# Altium footprint library mmyLibrary.PcbLib: 231 footprints (part 1 of 15)
Each footprint in its own frame and in the unit in brackets; x right, y up, seen from the top. Pads: shape width x height; smd on the part's side, far side on the other; paste and mask are expansions set on the pad; w line width, h text height; cw(c..) or ccw(c..) is an arc to the next point about the centre after c.
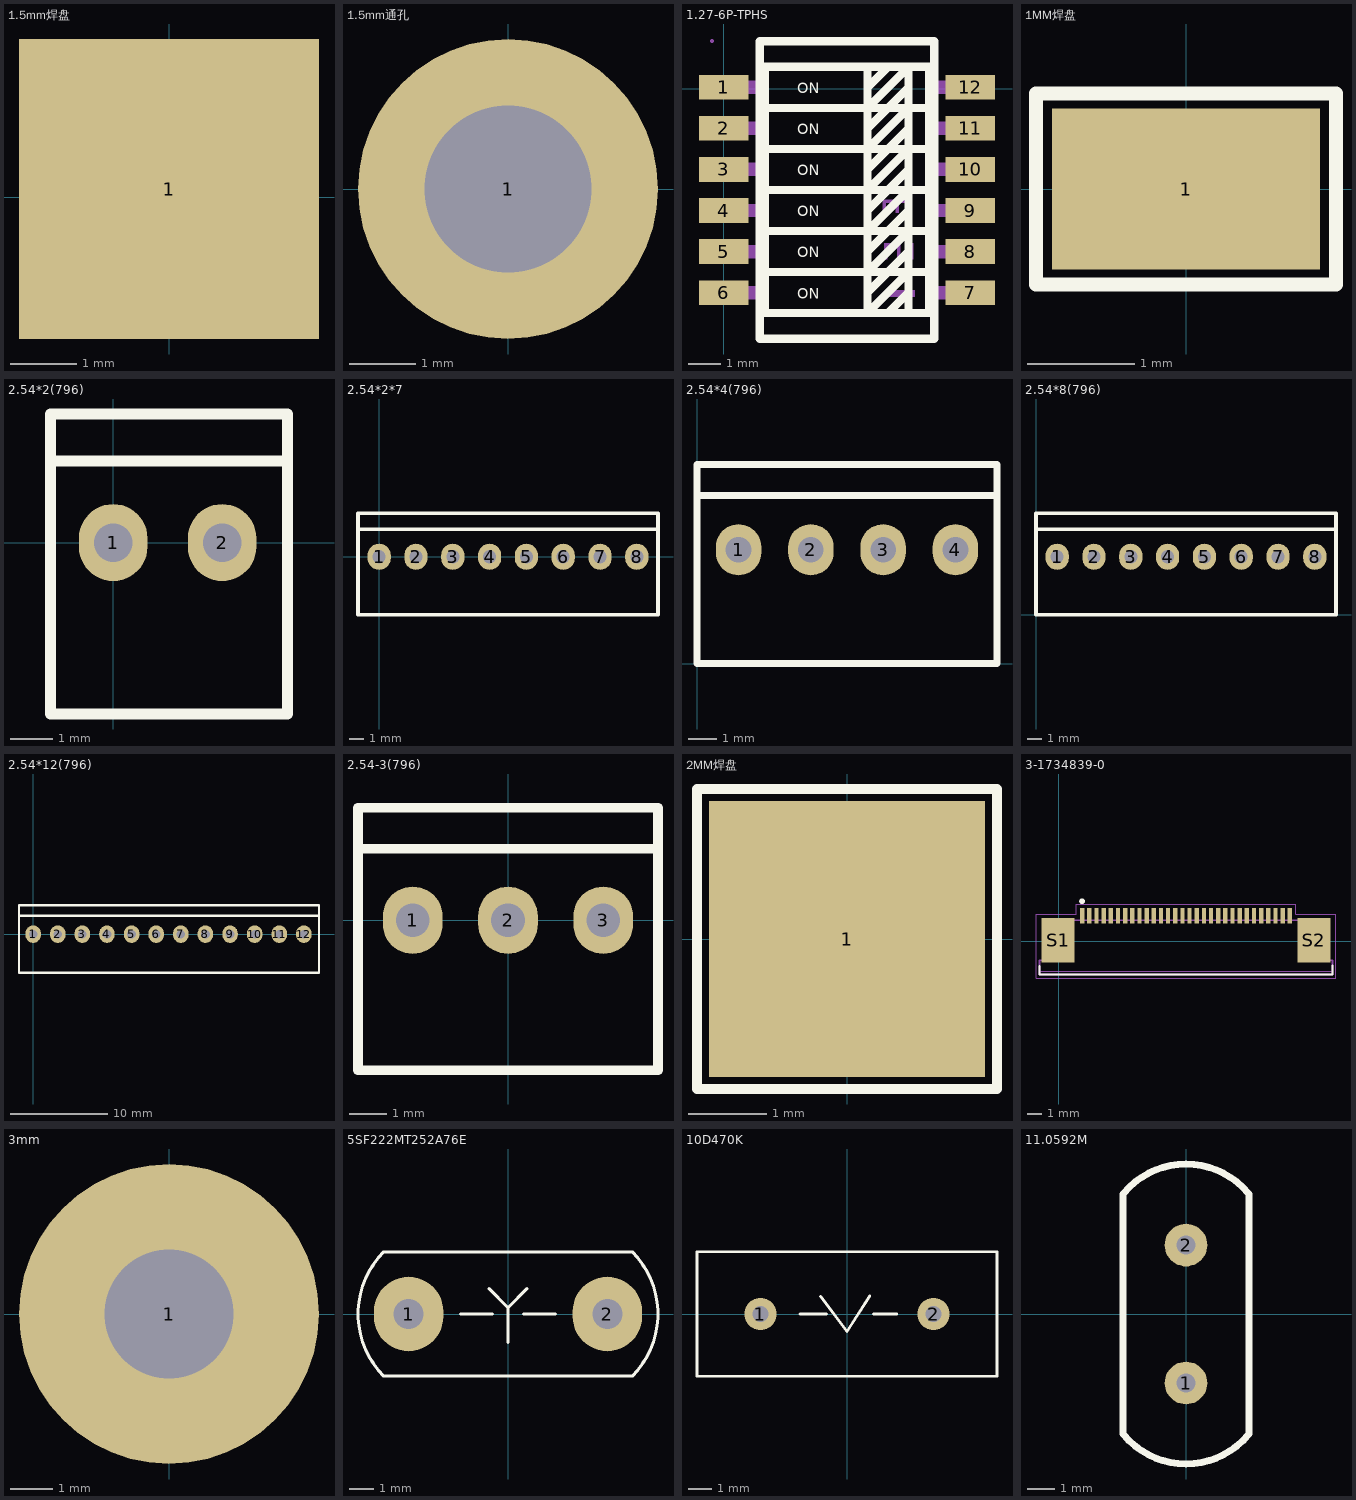
[diagram p0: the footprints below, top view; thin cyan lines are the x and y axes]

## 1.5mm焊盘 [mm]
pads (1):
  rect 4.5x4.5 smd: 1(0,0.127)

## 1.5mm通孔 [mm]
pads (1):
  round 4.5 hole 2.5: 1(0,0)

## 1.27-6P-TPHS [mil]
pads (12):
  rect 60x30 smd mask+2: 1(0,1.5) 2(0,-48.5) 3(0,-98.5) 4(0,-148.5) 5(0,-198.5) 6(0,-248.5) 7(300,-248.5) 8(300,-198.5) 9(300,-148.5) 10(300,-98.5) 11(300,-48.5) 12(300,1.5)
Top Overlay:
  lines w10: 175,-248.5 200,-223.5 225,-198.5 ; 175,-198.5 200,-173.5 225,-148.5 ; 175,-148.5 200,-123.5 225,-98.5 ; 175,-98.5 200,-73.5 225,-48.5 ; 175,-48.5 200,-23.5 225,1.5 ; 175,1.5 200,26.5 ; 175,26.5 175,-23.5 ; 200,-273.5 225,-248.5 ; 225,-273.5 225,-223.5 ; 50,-223.5 50,-173.5 ; 50,-223.5 250,-223.5 ; 50,-223.5 250,-223.5 ; 50,-223.5 250,-223.5 ; 50,-223.5 50,-273.5 250,-273.5 250,-223.5 ; 50,-223.5 250,-223.5 ; 50,-223.5 250,-223.5 ; 50,-223.5 250,-223.5 ; 50,-173.5 250,-173.5 ; 50,-173.5 250,-173.5 ; 50,-173.5 250,-173.5 ; 50,-173.5 250,-173.5 ; 50,-173.5 250,-173.5 ; 50,-173.5 50,-123.5 ; 50,-123.5 250,-123.5 ; 50,-123.5 250,-123.5 ; 50,-123.5 250,-123.5 ; 50,-123.5 250,-123.5 ; 50,-123.5 50,-73.5 ; 50,-73.5 250,-73.5 ; 50,-73.5 250,-73.5 ; 50,-73.5 250,-73.5 ; 50,-73.5 50,-23.5 ; 50,-23.5 250,-23.5 ; 50,-23.5 250,-23.5 ; 50,-23.5 50,26.5 250,26.5 250,-23.5 ; 175,-223.5 225,-173.5 ; 175,-223.5 175,-273.5 225,-223.5 ; 175,-223.5 175,-173.5 ; 175,-173.5 225,-123.5 ; 175,-173.5 175,-123.5 ; 175,-123.5 175,-73.5 ; 175,-123.5 225,-73.5 ; 175,-73.5 225,-23.5 ; 175,-73.5 175,-23.5 ; 175,-23.5 225,26.5 225,-23.5 ; 225,-223.5 225,-173.5 ; 225,-173.5 225,-123.5 ; 225,-123.5 225,-73.5 ; 225,-73.5 225,-23.5 ; 250,-223.5 250,-173.5 ; 250,-173.5 250,-123.5 ; 250,-123.5 250,-73.5 ; 250,-73.5 250,-23.5 ; 43.7,-304.6 43.7,57.6 256.3,57.6 256.3,-304.6 43.7,-304.6
  text "ON" at 89.46,-255.71 h12.98
  text "ON" at 89.46,-205.71 h12.98
  text "ON" at 89.46,-155.71 h12.98
  text "ON" at 89.46,-5.71 h12.98
  text "ON" at 89.46,-55.71 h12.98
  text "ON" at 89.46,-105.71 h12.98
Mechanical 6:
  region: 193.3,-155 193.3,-135.3 228.7,-135.3 228.7,-155 224.8,-155 224.8,-139.2 213,-139.2 213,-151.1 209.1,-151.1 209.1,-139.2 197.2,-139.2 197.2,-155
  region: 195.3,-204.2 195.3,-188.5 215,-188.5 215,-204.2 226.8,-204.2 226.8,-188.5 230.7,-188.5 230.7,-208.1 211,-208.1 211,-192.4 199.2,-192.4 199.2,-208.1 195.3,-208.1
  region: 197.2,-253.4 232.7,-253.4 232.7,-245.5 197.2,-245.5
Mechanical 15:
  region: 314.4,-106.4 281.7,-106.4 281.7,-90.6 314.4,-90.6
  region: 282.1,-106.4 255.9,-106.4 255.9,-90.6 282.1,-90.6
  region: 18.3,-106.4 -14.4,-106.4 -14.4,-90.6 18.3,-90.6
  region: 44.1,-106.4 17.9,-106.4 17.9,-90.6 44.1,-90.6
  region: 18.3,-56.4 -14.4,-56.4 -14.4,-40.6 18.3,-40.6
  region: 44.1,-56.4 17.9,-56.4 17.9,-40.6 44.1,-40.6
  region: 314.4,-56.4 281.7,-56.4 281.7,-40.6 314.4,-40.6
  region: 282.1,-56.4 255.9,-56.4 255.9,-40.6 282.1,-40.6
  region: 314.4,-6.4 281.7,-6.4 281.7,9.4 314.4,9.4
  region: 282.1,-6.4 255.9,-6.4 255.9,9.4 282.1,9.4
  region: 18.3,-6.4 -14.4,-6.4 -14.4,9.4 18.3,9.4
  region: 44.1,-6.4 17.9,-6.4 17.9,9.4 44.1,9.4
  region: 18.3,-156.4 -14.4,-156.4 -14.4,-140.6 18.3,-140.6
  region: 44.1,-156.4 17.9,-156.4 17.9,-140.6 44.1,-140.6
  region: 314.4,-156.4 281.7,-156.4 281.7,-140.6 314.4,-140.6
  region: 282.1,-156.4 255.9,-156.4 255.9,-140.6 282.1,-140.6
  region: 314.4,-206.4 281.7,-206.4 281.7,-190.6 314.4,-190.6
  region: 282.1,-206.4 255.9,-206.4 255.9,-190.6 282.1,-190.6
  region: 18.3,-206.4 -14.4,-206.4 -14.4,-190.6 18.3,-190.6
  region: 44.1,-206.4 17.9,-206.4 17.9,-190.6 44.1,-190.6
  region: 18.3,-256.4 -14.4,-256.4 -14.4,-240.6 18.3,-240.6
  region: 44.1,-256.4 17.9,-256.4 17.9,-240.6 44.1,-240.6
  region: 314.4,-256.4 281.7,-256.4 281.7,-240.6 314.4,-240.6
  region: 282.1,-256.4 255.9,-256.4 255.9,-240.6 282.1,-240.6
  region: -14.4,60.4 -15.39,60.4 -16.8,58.99 -16.8,57.01 -15.39,55.6 -14.4,55.6 -13.41,55.6 -12,57.01 -12,58.99 -13.41,60.4
  lines w2: 43.7,-305 43.7,58 256.3,58 256.3,-305 43.7,-305

## 1MM焊盘 [mm]
pads (1):
  rect 2.5x1.5 smd: 1(0,0)
Top Overlay:
  lines w0.127: -1.397,-0.889 -0.889,-0.889 1.397,-0.889 1.397,0.889 -1.397,0.889 -1.397,-0.889

## 2.54*2(796) [mm]
pads (2):
  oval 1.6x1.8 hole 0.9: 1(0,0) 2(2.54,0)
Top Overlay:
  lines w0.254: -1.46,1.905 4.064,1.905 ; -1.46,-4 4.064,-4 4.064,3 -1.46,3 -1.46,-4

## 2.54*2*7 [mm]
pads (8):
  oval 1.6x1.8 hole 0.9: 1(0,0) 2(2.54,0) 3(5.08,0) 4(7.62,0) 5(10.16,0) 6(12.7,0) 7(15.24,0) 8(17.78,0)
Top Overlay:
  lines w0.254: -1.46,1.905 19.24,1.905 ; -1.46,-4 19.24,-4 19.24,3 -1.46,3 -1.46,-4

## 2.54*4(796) [mm]
pads (4):
  oval 1.6x1.8 hole 0.9: 1(1.46,4) 2(4,4) 3(6.54,4) 4(9.08,4)
Top Overlay:
  lines w0.254: 0,5.905 10.54,5.905 ; 0,0 10.54,0 10.54,7 0,7 0,0

## 2.54*8(796) [mm]
pads (8):
  oval 1.6x1.8 hole 0.9: 1(1.46,4) 2(4,4) 3(6.54,4) 4(9.08,4) 5(11.62,4) 6(14.16,4) 7(16.7,4) 8(19.24,4)
Top Overlay:
  lines w0.254: 0,5.905 20.7,5.905 ; 0,0 20.7,0 20.7,7 0,7 0,0

## 2.54*12(796) [mm]
pads (12):
  oval 1.6x1.8 hole 0.9: 1(0,0) 2(2.54,0) 3(5.08,0) 4(7.62,0) 5(10.16,0) 6(12.7,0) 7(15.24,0) 8(17.78,0) 9(20.32,0) 10(22.86,0) 11(25.4,0) 12(27.94,0)
Top Overlay:
  lines w0.254: -1.46,1.905 29.5,1.905 ; -1.46,-4 29.5,-4 29.5,3 -1.46,3 -1.46,-4

## 2.54-3(796) [mm]
pads (3):
  oval 1.6x1.8 hole 0.9: 1(-2.54,0) 2(0,0) 3(2.54,0)
Top Overlay:
  lines w0.254: -4,1.905 4,1.905 ; -4,-4 -4,3 4,3 4,-4 -4,-4

## 2MM焊盘 [mm]
pads (1):
  rect 3.5x3.5 smd: 1(0,0)
Top Overlay:
  lines w0.127: -1.905,-1.905 1.905,-1.905 1.905,1.905 -1.905,1.905 -1.905,-0.889 -1.905,-1.905

## 3-1734839-0 [mm]
pads (32):
  rect 0.3x1.1 smd: 1(1.64,1.778) 2(2.14,1.778) 3(2.64,1.778) 4(3.14,1.778) 5(3.64,1.778) 6(4.14,1.778) 7(4.64,1.778) 8(5.14,1.778) 9(5.64,1.778) 10(6.14,1.778) 11(6.64,1.778) 12(7.14,1.778) 13(7.64,1.778) 14(8.14,1.778) 15(8.64,1.778) 16(9.14,1.778) 17(9.64,1.778) 18(10.14,1.778) 19(10.64,1.778) 20(11.14,1.778) 21(11.64,1.778) 22(12.14,1.778) 23(12.64,1.778) 24(13.14,1.778) 25(13.64,1.778) 26(14.14,1.778) 27(14.64,1.778) 28(15.14,1.778) 29(15.64,1.778) 30(16.14,1.778)
  rect 2.3x3.1 smd: S1(-0.03,0.078) S2(17.81,0.078)
Top Overlay:
  circle w0.2: c1.635,2.799 r0.1
  lines w0.127: -1.326,-1.71 -1.325,-2.322 19.105,-2.322 19.105,-1.666
Mechanical 13:
  lines w0.076: -1.25,-2.072 19.03,-2.072
  lines w0.127: -1.325,-2.322 -1.325,-1.322 -0.67,-1.322 -0.67,1.478 18.45,1.478 18.45,-1.322 19.105,-1.322 19.105,-2.322 -1.325,-2.322
Mechanical 15:
  lines w0.05: -1.575,-2.572 19.355,-2.572 19.355,1.878 16.54,1.878 16.54,2.578 1.24,2.578 1.24,1.878 -1.575,1.878 -1.575,-2.572
3D body "c-3-1734839-0-c-3d.stp": height 2.1, standoff 0.05, extent -1.325,-2.951 19.105,2.159

## 3mm [mm]
pads (1):
  round 7 hole 3: 1(0,0)

## 5SF222MT252A76E [mm] "2220PF"
pads (2):
  oval 2.8x3 hole 1.2: 1(-4,0) 2(4,0)
Top Overlay:
  lines w0.127: -1.905,0 -0.635,0 ; -0.762,1.016 0,0.254 ; 0,-1.143 0,0.254 ; 0.635,0 1.905,0 ; 0.762,1.016 0,0.254 ; -5,-2.5 cw(c-2.5,0) -5,2.5 5,2.5 cw(c2.5,0) 5,-2.5 -5,-2.5

## 10D470K [mm]
pads (2):
  round 1.4 hole 0.7: 1(-3.75,0) 2(3.75,0)
Top Overlay:
  lines w0.12: -2.032,0 -0.889,0 ; -1.143,0.762 0,-0.762 0.983,0.783 ; 1.143,0 2.159,0 ; -6.5,-2.7 -6.5,2.7 6.5,2.7 6.5,-2.7 -6.5,-2.7

## 11.0592M [mil]
pads (2):
  round 62 hole 28: 1(0,-100) 2(0,100)
Top Overlay:
  lines w10: -91.54,-174.01 -91.54,174.02 ; -90.02,175.54 cw(c0,100) 90.02,175.54 ; -89.94,-175.47 ccw(c0,-100) 89.94,-175.47 ; 91.53,-174.01 91.53,174